# Altium integrated library Res-THP_V2.IntLib: 460 symbols (part 2 of 3) (continued)
## 100R-1W-PR01-5%
designator R?  value 100R  Watt: 1W  (hidden comment: 100R-1W-PR01-5%)
Resistor Power Metal Film; Manufacturer: Various; Part Number: 100R 5% 1W; Tol: 5%; Package: RES-PR01; EDM-PN: *; Text2: *; Text1: *
footprint RES-PR01 (RES-PR01 6.5x2.5mm)
pins: 1, 2

## 100R-2W-5%-MOF-1000
designator R?, comment value 100R  Watt: 2W  (hidden comment: 100R-2W-5%)
Resistor Metal Oxide Film; Manufacturer: Various; Part Number: 100R 5% 2W MOF; Tol: 5%; Package: RES-2W-1000; EDM-PN: *; Text2: *; Text1: *
footprint RES-2W-1000 (RES 2W 12.0x5.0mm)
pins: 1, 2

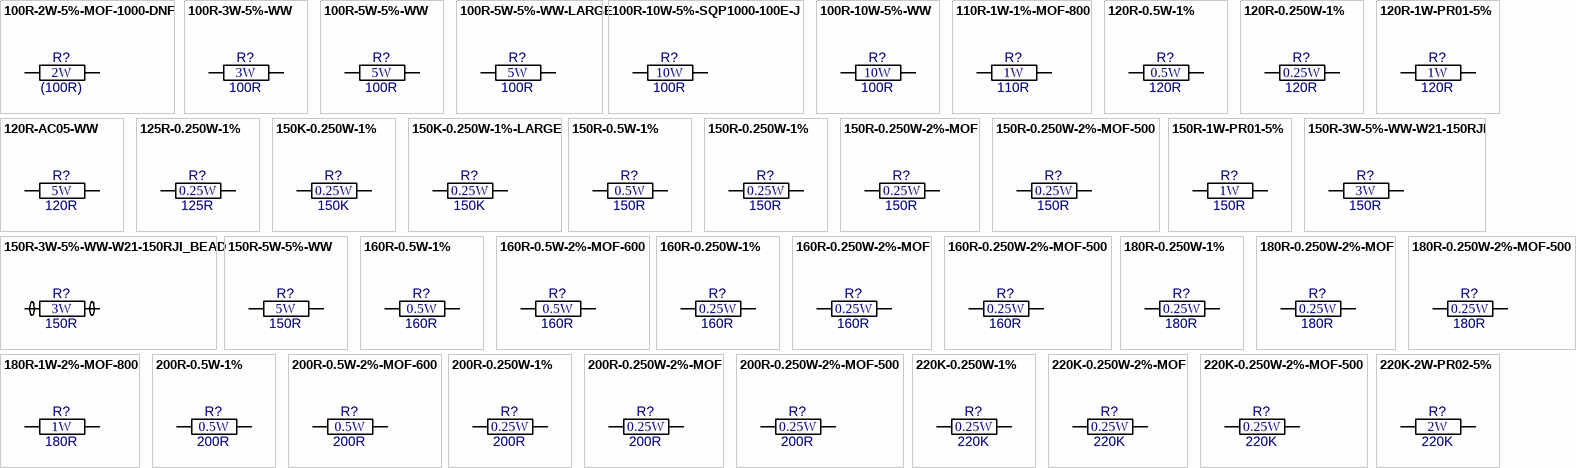
[diagram p8: symbols 100R-2W-5%-MOF-1000-DNF to 220K-2W-PR02-5%]

## 100R-2W-5%-MOF-1000-DNF
designator R?, comment value (100R)  Watt: 2W  (hidden comment: 100R-2W-5%)
Resistor Metal Oxide Film - Do not Fit; Manufacturer: Various; Part Number: DNF - 100R 5% 2W MOF; Tol: 5%; Package: RES-2W-1000; EDM-PN: *; Text2: *; Text1: *
footprint RES-2W-1000 (RES 2W 12.0x5.0mm)
pins: 1, 2

## 100R-3W-5%-WW
designator R?  value 100R  Watt: 3W  (hidden comment: 100R-3W-5%-WW)
Resistor Wirewound; Manufacturer: Various; Part Number: 100R 5% 3W WW; Tol: 5%; Package: RES-3W-WW; EDM-PN: *; Text2: *; Text1: *
footprint Res-3W-WW (Res 3W WW 13.0x5.5mm)
pins: 1, 2

## 100R-5W-5%-WW
designator R?  value 100R  Watt: 5W  (hidden comment: 100R-5W-5%-WW)
Resistor Wirewound; Manufacturer: Various; Part Number: 100R 5% 5W WW; Tol: 5%; Package: RES-5W-WW; EDM-PN: *; Text2: *; Text1: *
footprint Res-5W-WW (Res 5W WW 17.0x7.5mm)
pins: 1, 2

## 100R-5W-5%-WW-LARGE
designator R?, comment value 100R  Watt: 5W  (hidden comment: 100R-5W-5%-WW)
Resistor Wirewound; Manufacturer: Various; Part Number: 100R 5% 5W WW; Tol: 5%; Package: Res-5W-WW-LARGE; EDM-PN: *; Text2: *; Text1: *
footprint Res-5W-WW-LARGE (Res 5W WW 17.0x7.5mm)
pins: 1, 2

## 100R-10W-5%-SQP1000-100E-J
designator R?, comment value 100R  Watt: 10W  (hidden comment: SQP1000-100E-J)
Resistor Wirewound Cement/Ceramic; Manufacturer: HKR/Mantech; EDM-PN: RES1580; Tol: 5%; Part Number: SQP1000-100E-J; Package: RES-SQP1000; Text2: *; Text1: *
footprint RES-SQP1000 (SQP1000  48.0x9.5mm)
pins: 1, 2

## 100R-10W-5%-WW
designator R?  value 100R  Watt: 10W  (hidden comment: 100R-10W-5%-WW)
Resistor Wirewound; Manufacturer: Various; Part Number: 100R 5% 10W WW; Tol: 5%; Package: RES-10W-WW; EDM-PN: *; Text2: *; Text1: *
footprint Res-10W-WW (Res 10W WW 44.0x8.0mm)
pins: 1, 2

## 110R-1W-1%-MOF-800
designator R?, comment value 110R  Watt: 1W  (hidden comment: 110R-1W-1%)
Resistor Metal Oxide Film; Manufacturer: Various; Part Number: 110R 1% 1W MOF; Tol: 1%; Package: RES-1W-800; EDM-PN: *; Text2: *; Text1: *
footprint RES-1W-800 (RES 1W 12.0x5.0mm)
pins: 1, 2

## 120R-0.5W-1%
designator R?, comment value 120R  Watt: 0.5W  (hidden comment: 120R-0.5W-1%_H)
Resistor Metal Film; Manufacturer: Various; Part Number: 120R 1% 0.5W; Tol: 1%; Package: RES-0.5W; EDM-PN: *; Text2: *; Text1: *
footprint RES-0.5W (RES-0.5W 10.0x3.8mm)
pins: 1, 2

## 120R-0.250W-1%
designator R?, comment value 120R  Watt: 0.25W  (hidden comment: 120R-0.250W-1%_H)
Resistor Metal Film; Manufacturer: Various; Part Number: 120R 1% 0.25W; Tol: 1%; Package: RES-0.250W; EDM-PN: *; Text2: *; Text1: *
footprint RES-0.250W (Res 0.25W 7.6x2.3mm)
pins: 1, 2

## 120R-1W-PR01-5%
designator R?  value 120R  Watt: 1W  (hidden comment: 120R-1W-PR01-5%)
Resistor Power Metal Film; Manufacturer: Various; Part Number: 120R 5% 1W; Tol: 5%; Package: RES-PR01; EDM-PN: *; Text2: *; Text1: *
footprint RES-PR01 (RES-PR01 6.5x2.5mm)
pins: 1, 2

## 120R-AC05-WW
designator R?  value 120R  Watt: 5W  (hidden comment: 120R-AC05-WW)
Resistor Wirewound; Manufacturer: Various; Part Number: 120R 5% AC05; Tol: 5%; Package: RES-AC05; EDM-PN: *; Text2: *; Text1: *
footprint Res-AC05 (Res AC05 18.0x10.0mm)
pins: 1, 2

## 125R-0.250W-1%
designator R?, comment value 125R  Watt: 0.25W  (hidden comment: 125R-0.250W-1%_H)
Resistor Metal Film; Manufacturer: Various; Part Number: 125R 1% 0.25W; Tol: 1%; Package: RES-0.250W; EDM-PN: *; Text2: *; Text1: *
footprint RES-0.250W (Res 0.25W 7.6x2.3mm)
pins: 1, 2

## 150K-0.250W-1%
designator R?, comment value 150K  Watt: 0.25W  (hidden comment: 150K-0.250W-1%_H)
Resistor Metal Film; Manufacturer: Various; Part Number: 150K 1% 0.25W; Tol: 1%; Package: RES-0.250W; EDM-PN: *; Text2: *; Text1: *
footprint RES-0.250W (Res 0.25W 7.6x2.3mm)
pins: 1, 2

## 150K-0.250W-1%-LARGE
designator R?, comment value 150K  Watt: 0.25W  (hidden comment: 150K-0.250W-1%_H)
Resistor Metal Film; Manufacturer: Various; Part Number: 150K 1% 0.25W; Tol: 1%; Package: RES-0.250W-LARGE; EDM-PN: *; Text2: *; Text1: *
footprint RES-0.250W-LARGE (Res 0.25W 7.6x2.3mm)
pins: 1, 2

## 150R-0.5W-1%
designator R?, comment value 150R  Watt: 0.5W  (hidden comment: 150R-0.5W-1%_H)
Resistor Metal Film; Manufacturer: Various; Part Number: 150R 1% 0.5W; Tol: 1%; Package: RES-0.5W; EDM-PN: *; Text2: *; Text1: *
footprint RES-0.5W (RES-0.5W 10.0x3.8mm)
pins: 1, 2

## 150R-0.250W-1%
designator R?, comment value 150R  Watt: 0.25W  (hidden comment: 150R-0.250W-1%_H)
Resistor Metal Film; Manufacturer: Various; Part Number: 150R 1% 0.25W; Tol: 1%; Package: RES-0.250W; EDM-PN: *; Text2: *; Text1: *
footprint RES-0.250W (Res 0.25W 7.6x2.3mm)
pins: 1, 2

## 150R-0.250W-2%-MOF
designator R?, comment value 150R  Watt: 0.25W  (hidden comment: 150R-0.250W-2%)
Resistor Metal Oxide Film; Manufacturer: Various; Part Number: 150R 2% 0.25W MOF; Tol: 2%; Package: RES-0.250W; EDM-PN: *; Text2: *; Text1: *
footprint RES-0.250W (Res 0.25W 7.6x2.3mm)
pins: 1, 2

## 150R-0.250W-2%-MOF-500
designator R?, comment value 150R  Watt: 0.25W  (hidden comment: 150R-0.250W-2%)
Resistor Metal Oxide Film; Manufacturer: Various; Part Number: 150R 2% 0.25W MOF; Tol: 2%; Package: RES-0.250W-500; EDM-PN: *; Text2: *; Text1: *
footprint RES-0.250W-500 (Res 0.25W 7.6x2.3mm)
pins: 1, 2

## 150R-1W-PR01-5%
designator R?  value 150R  Watt: 1W  (hidden comment: 150R-1W-PR01-5%)
Resistor Power Metal Film; Manufacturer: Various; Part Number: 150R 5% 1W; Tol: 5%; Package: RES-PR01; EDM-PN: *; Text2: *; Text1: *
footprint RES-PR01 (RES-PR01 6.5x2.5mm)
pins: 1, 2

## 150R-3W-5%-WW-W21-150RJI
designator R?, comment value 150R  Watt: 3W  (hidden comment: W21-150RJI)
Resistor Wirewound; Manufacturer: TT Electronics/Welwyn; Tol: 5%; Part Number: W21-150RJI; Package: RES-W21; EDM-PN: *; Text2: *; Text1: *
footprint Res-W21 (Res W21 12.7x5.6mm)
pins: 1, 2

## 150R-3W-5%-WW-W21-150RJI_BEAD
designator R?, comment value 150R  Watt: 3W  (hidden comment: W21-150RJI)
Resistor Wirewound and Bead; Manufacturer: TT Electronics/Welwyn & RS; Part Number: W21-150RJI & 536-4062; Tol: 5%; Package: RES-W21-BEAD; EDM-PN: *; Text2: *; Text1: *
footprint Res-W21-BEAD (Res W21 12.7x5.6mm)
pins: 1, 2

## 150R-5W-5%-WW
designator R?  value 150R  Watt: 5W  (hidden comment: 150R-5W-5%-WW)
Resistor Wirewound; Manufacturer: Various; Part Number: 150R 5% 5W WW; Tol: 5%; Package: RES-5W-WW; EDM-PN: *; Text2: *; Text1: *
footprint Res-5W-WW (Res 5W WW 17.0x7.5mm)
pins: 1, 2

## 160R-0.5W-1%
designator R?, comment value 160R  Watt: 0.5W  (hidden comment: 160R-0.5W-1%_H)
Resistor Metal Film; Manufacturer: Various; Part Number: 160R 1% 0.5W; Tol: 1%; Package: RES-0.5W; EDM-PN: *; Text2: *; Text1: *
footprint RES-0.5W (RES-0.5W 10.0x3.8mm)
pins: 1, 2

## 160R-0.5W-2%-MOF-600
designator R?, comment value 160R  Watt: 0.5W  (hidden comment: 160R-0.5W-2%)
Resistor Metal Oxide Film; Manufacturer: Various; Part Number: 160R 2% 0.5W MOF; Tol: 2%; Package: RES-0.5W-600; EDM-PN: *; Text2: *; Text1: *
footprint RES-0.5W-600 (RES-0.5W 10.0x3.8mm)
pins: 1, 2

## 160R-0.250W-1%
designator R?, comment value 160R  Watt: 0.25W  (hidden comment: 160R-0.250W-1%_H)
Resistor Metal Film; Manufacturer: Various; Part Number: 160R 1% 0.25W; Tol: 1%; Package: RES-0.250W; EDM-PN: *; Text2: *; Text1: *
footprint RES-0.250W (Res 0.25W 7.6x2.3mm)
pins: 1, 2

## 160R-0.250W-2%-MOF
designator R?, comment value 160R  Watt: 0.25W  (hidden comment: 160R-0.250W-2%)
Resistor Metal Oxide Film; Manufacturer: Various; Part Number: 160R 2% 0.25W MOF; Tol: 2%; Package: RES-0.250W; EDM-PN: *; Text2: *; Text1: *
footprint RES-0.250W (Res 0.25W 7.6x2.3mm)
pins: 1, 2

## 160R-0.250W-2%-MOF-500
designator R?, comment value 160R  Watt: 0.25W  (hidden comment: 160R-0.250W-2%)
Resistor Metal Oxide Film; Manufacturer: Various; Part Number: 160R 2% 0.25W MOF; Tol: 2%; Package: RES-0.250W-500; EDM-PN: *; Text2: *; Text1: *
footprint RES-0.250W-500 (Res 0.25W 7.6x2.3mm)
pins: 1, 2

## 180R-0.250W-1%
designator R?  value 180R  Watt: 0.25W  (hidden comment: 180R-0.250W-1%)
Resistor Metal Film; Manufacturer: Various; Part Number: 180R 1% 0.25W; Tol: 1%; Package: RES-0.250W; EDM-PN: *; Text2: *; Text1: *
footprint RES-0.250W (Res 0.25W 7.6x2.3mm)
pins: 1, 2

## 180R-0.250W-2%-MOF
designator R?, comment value 180R  Watt: 0.25W  (hidden comment: 180R-0.250W-2%)
Resistor Metal Oxide Film; Manufacturer: Various; Part Number: 180R 2% 0.25W MOF; Tol: 2%; Package: RES-0.250W; EDM-PN: *; Text2: *; Text1: *
footprint RES-0.250W (Res 0.25W 7.6x2.3mm)
pins: 1, 2

## 180R-0.250W-2%-MOF-500
designator R?, comment value 180R  Watt: 0.25W  (hidden comment: 180R-0.250W-2%_H)
Resistor Metal Oxide Film; Manufacturer: Various; Part Number: 180R 2% 0.25W MOF; Tol: 2%; Package: RES-0.250W-500; EDM-PN: *; Text2: *; Text1: *
footprint RES-0.250W-500 (Res 0.25W 7.6x2.3mm)
pins: 1, 2

## 180R-1W-2%-MOF-800
designator R?, comment value 180R  Watt: 1W  (hidden comment: 180R-1W-2%)
Resistor Metal Oxide Film; Manufacturer: Various; Part Number: 180R 2% 1W MOF; Tol: 2%; Package: RES-1W-800; EDM-PN: *; Text2: *; Text1: *
footprint RES-1W-800 (RES 1W 12.0x5.0mm)
pins: 1, 2

## 200R-0.5W-1%
designator R?  value 200R  Watt: 0.5W  (hidden comment: 200R-0.5W-1%)
Resistor Metal Film; Manufacturer: Various; Part Number: 200R 1% 0.5W; Tol: 1%; Package: RES-0.5W; EDM-PN: *; Text2: *; Text1: *
footprint RES-0.5W (RES-0.5W 10.0x3.8mm)
pins: 1, 2

## 200R-0.5W-2%-MOF-600
designator R?, comment value 200R  Watt: 0.5W  (hidden comment: 200R-0.5W-2%)
Resistor Metal Oxide Film; Manufacturer: Various; Part Number: 200R 2% 0.5W MOF; Tol: 2%; Package: RES-0.5W-600; EDM-PN: *; Text2: *; Text1: *
footprint RES-0.5W-600 (RES-0.5W 10.0x3.8mm)
pins: 1, 2

## 200R-0.250W-1%
designator R?  value 200R  Watt: 0.25W  (hidden comment: 200R-0.250W-1%)
Resistor Metal Film; Manufacturer: Various; Part Number: 200R 1% 0.25W; Tol: 1%; Package: RES-0.250W; EDM-PN: *; Text2: *; Text1: *
footprint RES-0.250W (Res 0.25W 7.6x2.3mm)
pins: 1, 2

## 200R-0.250W-2%-MOF
designator R?, comment value 200R  Watt: 0.25W  (hidden comment: 200R-0.250W-2%)
Resistor Metal Oxide Film; Manufacturer: Various; Part Number: 200R 2% 0.25W MOF; Tol: 2%; Package: RES-0.250W; EDM-PN: *; Text2: *; Text1: *
footprint RES-0.250W (Res 0.25W 7.6x2.3mm)
pins: 1, 2

## 200R-0.250W-2%-MOF-500
designator R?, comment value 200R  Watt: 0.25W  (hidden comment: 200R-0.250W-2%)
Resistor Metal Oxide Film; Manufacturer: Various; Part Number: 200R 2% 0.25W MOF; Tol: 2%; Package: RES-0.250W-500; EDM-PN: *; Text2: *; Text1: *
footprint RES-0.250W-500 (Res 0.25W 7.6x2.3mm)
pins: 1, 2

## 220K-0.250W-1%
designator R?  value 220K  Watt: 0.25W  (hidden comment: 220K-0.250W-1%)
Resistor Metal Film; Manufacturer: Various; Part Number: 220K 1% 0.25W; Tol: 1%; Package: RES-0.250W; EDM-PN: *; Text2: *; Text1: *
footprint RES-0.250W (Res 0.25W 7.6x2.3mm)
pins: 1, 2

## 220K-0.250W-2%-MOF
designator R?, comment value 220K  Watt: 0.25W  (hidden comment: 220K-0.250W-2%)
Resistor Metal Oxide Film; Manufacturer: Various; Part Number: 220K 2% 0.25W MOF; Tol: 2%; Package: RES-0.250W; EDM-PN: *; Text2: *; Text1: *
footprint RES-0.250W (Res 0.25W 7.6x2.3mm)
pins: 1, 2

## 220K-0.250W-2%-MOF-500
designator R?, comment value 220K  Watt: 0.25W  (hidden comment: 220K-0.250W-2%)
Resistor Metal Oxide Film; Manufacturer: Various; Part Number: 220K 2% 0.25W MOF; Tol: 2%; Package: RES-0.250W-500; EDM-PN: *; Text2: *; Text1: *
footprint RES-0.250W-500 (Res 0.25W 7.6x2.3mm)
pins: 1, 2

## 220K-2W-PR02-5%
designator R?  value 220K  Watt: 2W  (hidden comment: 220K-2W-PR02-5%)
Resistor Power Metal Film; Manufacturer: Various; Part Number: 220K 5% 2W; Tol: 5%; Package: RES-PR02; EDM-PN: *; Text2: *; Text1: *
footprint RES-PR02 (RES 2W PMW 10.0x3.9mm)
pins: 1, 2

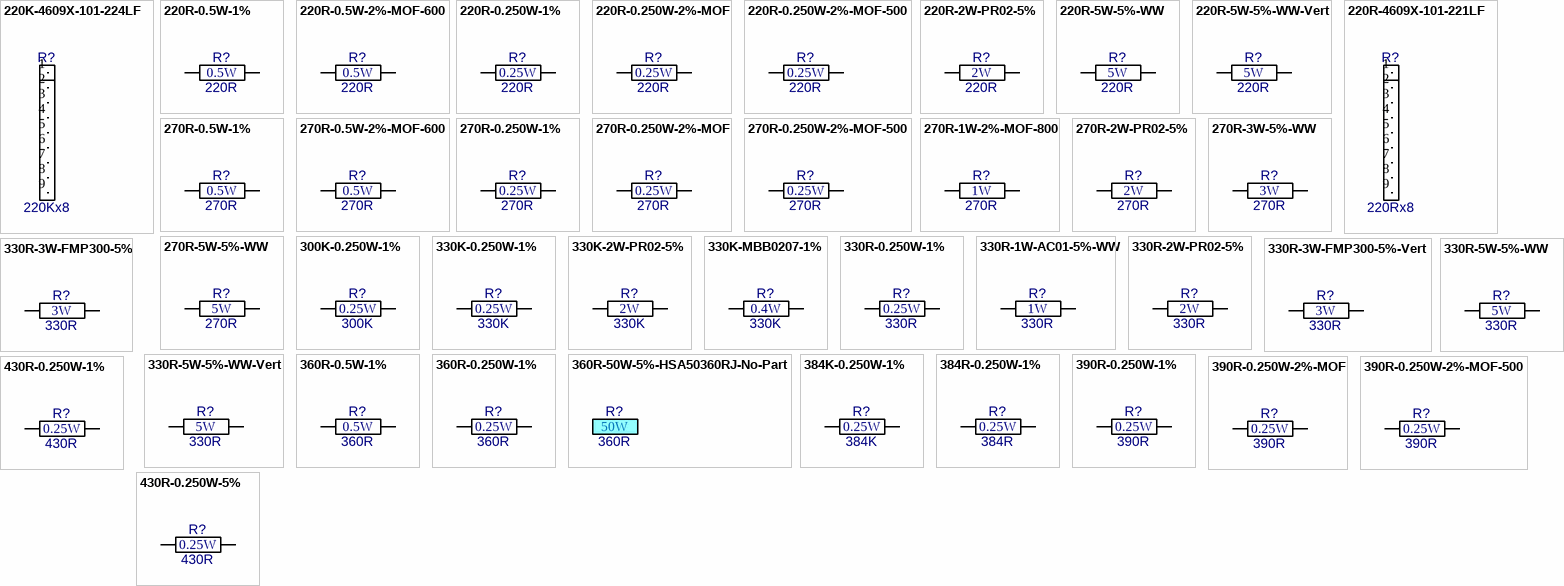
[diagram p9: symbols 220K-4609X-101-224LF to 430R-0.250W-5%]

## 220K-4609X-101-224LF
designator R?  value 220Kx8  (hidden comment: 220K-4609X-101-224LF)
Resistor Array 8 Res 9Pin; Manufacturer: Bourns; Tol: 1%; Watt: 200mW; Part Number: 4609X-101-224LF; Package: RES-4609X; EDM-PN: *; Text2: *; Text1: *
footprint RES-4609X (Res SIL 9 Pin 20.32x2.5mm)
pins: 1, 2, 3, 4, 5, 6, 7, 8, 9

## 220R-0.5W-1%
designator R?, comment value 220R  Watt: 0.5W  (hidden comment: 220R-0.5W-1%_H)
Resistor Metal Film; Manufacturer: Various; Part Number: 220R 1% 0.5W; Tol: 1%; Package: RES-0.5W; EDM-PN: *; Text2: *; Text1: *
footprint RES-0.5W (RES-0.5W 10.0x3.8mm)
pins: 1, 2

## 220R-0.5W-2%-MOF-600
designator R?, comment value 220R  Watt: 0.5W  (hidden comment: 220R-0.5W-2%_H)
Resistor Metal Oxide Film; Manufacturer: Various; Part Number: 220R 2% 0.5W MOF; Tol: 2%; Package: RES-0.5W-600; EDM-PN: *; Text2: *; Text1: *
footprint RES-0.5W-600 (RES-0.5W 10.0x3.8mm)
pins: 1, 2

## 220R-0.250W-1%
designator R?, comment value 220R  Watt: 0.25W  (hidden comment: 220R-0.250W-1%_H)
Resistor Metal Film; Manufacturer: Various; Part Number: 220R 1% 0.25W; Tol: 1%; Package: RES-0.250W; EDM-PN: *; Text2: *; Text1: *
footprint RES-0.250W (Res 0.25W 7.6x2.3mm)
pins: 1, 2

## 220R-0.250W-2%-MOF
designator R?, comment value 220R  Watt: 0.25W  (hidden comment: 220R-0.250W-2%)
Resistor Metal Oxide Film; Manufacturer: Various; Part Number: 220R 2% 0.25W MOF; Tol: 2%; Package: RES-0.250W; EDM-PN: *; Text2: *; Text1: *
footprint RES-0.250W (Res 0.25W 7.6x2.3mm)
pins: 1, 2

## 220R-0.250W-2%-MOF-500
designator R?, comment value 220R  Watt: 0.25W  (hidden comment: 220R-0.250W-2%_H)
Resistor Metal Oxide Film; Manufacturer: Various; Part Number: 220R 2% 0.25W MOF; Tol: 2%; Package: RES-0.250W-500; EDM-PN: *; Text2: *; Text1: *
footprint RES-0.250W-500 (Res 0.25W 7.6x2.3mm)
pins: 1, 2

## 220R-2W-PR02-5%
designator R?  value 220R  Watt: 2W  (hidden comment: 220R-2W-PR02-5%)
Resistor Power Metal Film; Manufacturer: Various; Part Number: 220R 5% 2W; Tol: 5%; Package: RES-PR02; EDM-PN: *; Text2: *; Text1: *
footprint RES-PR02 (RES 2W PMW 10.0x3.9mm)
pins: 1, 2

## 220R-5W-5%-WW
designator R?  value 220R  Watt: 5W  (hidden comment: 220R-5W-5%-WW)
Resistor Wirewound; Manufacturer: Various; Part Number: 220R 5% 5W WW; Tol: 5%; Package: RES-5W-WW; EDM-PN: *; Text2: *; Text1: *
footprint Res-5W-WW (Res 5W WW 17.0x7.5mm)
pins: 1, 2

## 220R-5W-5%-WW-Vert
designator R?, comment value 220R  Watt: 5W  (hidden comment: 220R-5W-5%-WW)
Resistor Wirewound; Manufacturer: Various; Part Number: 220R 5% 5W WW; Tol: 5%; Package: RES-5W-WW-Vert; EDM-PN: *; Text2: *; Text1: *
footprint Res-5W-WW-Vert (Res AC05 18.0x10.0mm)
pins: 1, 2

## 220R-4609X-101-221LF
designator R?  value 220Rx8  (hidden comment: 220R-4609X-101-221LF)
Resistor Array 8 Res 9Pin; Manufacturer: Bourns; Tol: 1%; Watt: 200mW; Part Number: 4609X-101-221LF; Package: RES-4609X; EDM-PN: *; Text2: *; Text1: *
footprint RES-4609X (Res SIL 9 Pin 20.32x2.5mm)
pins: 1, 2, 3, 4, 5, 6, 7, 8, 9

## 270R-0.5W-1%
designator R?, comment value 270R  Watt: 0.5W  (hidden comment: 270R-0.5W-1%_H)
Resistor Metal Film; Manufacturer: Various; Part Number: 270R 1% 0.5W; Tol: 1%; Package: RES-0.5W; EDM-PN: *; Text2: *; Text1: *
footprint RES-0.5W (RES-0.5W 10.0x3.8mm)
pins: 1, 2

## 270R-0.5W-2%-MOF-600
designator R?, comment value 270R  Watt: 0.5W  (hidden comment: 270R-0.5W-2%_H)
Resistor Metal Oxide Film; Manufacturer: Various; Part Number: 270R 2% 0.5W MOF; Tol: 2%; Package: RES-0.5W-600; EDM-PN: *; Text2: *; Text1: *
footprint RES-0.5W-600 (RES-0.5W 10.0x3.8mm)
pins: 1, 2

## 270R-0.250W-1%
designator R?, comment value 270R  Watt: 0.25W  (hidden comment: 270R-0.250W-1%_H)
Resistor Metal Film; Manufacturer: Various; Part Number: 270R 1% 0.25W; Tol: 1%; Package: RES-0.250W; EDM-PN: *; Text2: *; Text1: *
footprint RES-0.250W (Res 0.25W 7.6x2.3mm)
pins: 1, 2

## 270R-0.250W-2%-MOF
designator R?, comment value 270R  Watt: 0.25W  (hidden comment: 270R-0.250W-2%)
Resistor Metal Oxide Film; Manufacturer: Various; Part Number: 270R 2% 0.25W MOF; Tol: 2%; Package: RES-0.250W; EDM-PN: *; Text2: *; Text1: *
footprint RES-0.250W (Res 0.25W 7.6x2.3mm)
pins: 1, 2

## 270R-0.250W-2%-MOF-500
designator R?, comment value 270R  Watt: 0.25W  (hidden comment: 270R-0.250W-2%)
Resistor Metal Oxide Film; Manufacturer: Various; Part Number: 270R 2% 0.25W MOF; Tol: 2%; Package: RES-0.250W-500; EDM-PN: *; Text2: *; Text1: *
footprint RES-0.250W-500 (Res 0.25W 7.6x2.3mm)
pins: 1, 2

## 270R-1W-2%-MOF-800
designator R?, comment value 270R  Watt: 1W  (hidden comment: 270R-1W-2%)
Resistor Metal Oxide Film; Manufacturer: Various; Part Number: 270R 2% 1W MOF; Tol: 2%; Package: RES-1W-800; EDM-PN: *; Text2: *; Text1: *
footprint RES-1W-800 (RES 1W 12.0x5.0mm)
pins: 1, 2

## 270R-2W-PR02-5%
designator R?  value 270R  Watt: 2W  (hidden comment: 270R-2W-PR02-5%)
Resistor Power Metal Film; Manufacturer: Various; Part Number: 270R 5% 2W; Tol: 5%; Package: RES-PR02; EDM-PN: *; Text2: *; Text1: *
footprint RES-PR02 (RES 2W PMW 10.0x3.9mm)
pins: 1, 2

## 270R-3W-5%-WW
designator R?  value 270R  Watt: 3W  (hidden comment: 270R-3W-5%-WW)
Resistor Wirewound; Manufacturer: Various; Part Number: 270R 5% 3W WW; Tol: 5%; Package: RES-3W-WW; EDM-PN: *; Text2: *; Text1: *
footprint Res-3W-WW (Res 3W WW 13.0x5.5mm)
pins: 1, 2

## 270R-5W-5%-WW
designator R?  value 270R  Watt: 5W  (hidden comment: 270R-5W-5%-WW)
Resistor Wirewound; Manufacturer: Various; Part Number: 270R 5% 5W WW; Tol: 5%; Package: RES-5W-WW; EDM-PN: *; Text2: *; Text1: *
footprint Res-5W-WW (Res 5W WW 17.0x7.5mm)
pins: 1, 2

## 300K-0.250W-1%
designator R?, comment value 300K  Watt: 0.25W  (hidden comment: 300K-0.250W-1%_H)
Resistor Metal Film; Manufacturer: Various; Part Number: 300K 1% 0.25W; Tol: 1%; Package: RES-0.250W; EDM-PN: *; Text2: *; Text1: *
footprint RES-0.250W (Res 0.25W 7.6x2.3mm)
pins: 1, 2

## 330K-0.250W-1%
designator R?, comment value 330K  Watt: 0.25W  (hidden comment: 330K-0.250W-1%_H)
Resistor Metal Film; Manufacturer: Various; Part Number: 330K 1% 0.25W; Tol: 1%; Package: RES-0.250W; EDM-PN: *; Text2: *; Text1: *
footprint RES-0.250W (Res 0.25W 7.6x2.3mm)
pins: 1, 2

## 330K-2W-PR02-5%
designator R?  value 330K  Watt: 2W  (hidden comment: 330K-2W-PR02-5%)
Resistor Power Metal Film; Manufacturer: Various; Part Number: 330K 5% 2W; Tol: 5%; Package: RES-PR02; EDM-PN: *; Text2: *; Text1: *
footprint RES-PR02 (RES 2W PMW 10.0x3.9mm)
pins: 1, 2

## 330K-MBB0207-1%
designator R?, comment value 330K  Watt: 0.4W  (hidden comment: 330K-MBB0207-1%_H)
Resistor Metal Film; Manufacturer: Vishay; Part Number: 330K 1% MBB0207; Tol: 1%; Package: RES-MBB0207; EDM-PN: *; Text2: *; Text1: *; Reutech PN: 5905-99-0333
footprint RES-MBB0207 (MBB0207 6.3x2.5mm)
pins: 1, 2

## 330R-0.250W-1%
designator R?, comment value 330R  Watt: 0.25W  (hidden comment: 330R-0.250W-1%_H)
Resistor Metal Film; Manufacturer: Various; Part Number: 330R 1% 0.25W; Tol: 1%; Package: RES-0.250W; EDM-PN: *; Text2: *; Text1: *
footprint RES-0.250W (Res 0.25W 7.6x2.3mm)
pins: 1, 2

## 330R-1W-AC01-5%-WW
designator R?  value 330R  Watt: 1W  (hidden comment: 330R-1W-AC01-5%-WW)
Resistor Wirewound; Manufacturer: Vishay; Part Number: AC01000003300JA100; Tol: 5%; Package: RES-AC01; EDM-PN: *; Text2: *; Text1: *
footprint RES-AC01 (AC03 11.0x4.3mm)
pins: 1, 2

## 330R-2W-PR02-5%
designator R?  value 330R  Watt: 2W  (hidden comment: 330R-2W-PR02-5%)
Resistor Power Metal Film; Manufacturer: Various; Part Number: 330R 5% 2W; Tol: 5%; Package: RES-PR02; EDM-PN: *; Text2: *; Text1: *
footprint RES-PR02 (RES 2W PMW 10.0x3.9mm)
pins: 1, 2

## 330R-3W-FMP300-5%
designator R?  value 330R  Watt: 3W  (hidden comment: 330R-3W-FMP300-5%)
Resistor Power Metal Film; Manufacturer: Yageo; Part Number: FMP300JR-73-330R; Tol: 5%; Package: Res-FMP300; EDM-PN: *; Text2: *; Text1: *
footprint Res-FMP300 (FMP300 15.5x5.0mm)
pins: 1, 2

## 330R-3W-FMP300-5%-Vert
designator R?  value 330R  Watt: 3W  (hidden comment: 330R-3W-FMP300-5%-Vert)
Resistor Power Metal Film; Manufacturer: Yageo; Part Number: FMP300JR-73-330R; Tol: 5%; Package: Res-FMP300-Vert; EDM-PN: *; Text2: *; Text1: *
footprint Res-FMP300-Vert (FMP300 15.5x5.0mm)
pins: 1, 2

## 330R-5W-5%-WW
designator R?  value 330R  Watt: 5W  (hidden comment: 330R-5W-5%-WW)
Resistor Wirewound; Manufacturer: Various; Part Number: 330R 5% 5W WW; Tol: 5%; Package: RES-5W-WW; EDM-PN: *; Text2: *; Text1: *
footprint Res-5W-WW (Res 5W WW 17.0x7.5mm)
pins: 1, 2

## 330R-5W-5%-WW-Vert
designator R?, comment value 330R  Watt: 5W  (hidden comment: 330R-5W-5%-WW)
Resistor Wirewound; Manufacturer: Various; Part Number: 330R 5% 5W WW; Tol: 5%; Package: RES-5W-WW-Vert; EDM-PN: *; Text2: *; Text1: *
footprint Res-5W-WW-Vert (Res AC05 18.0x10.0mm)
pins: 1, 2

## 360R-0.5W-1%
designator R?  value 360R  Watt: 0.5W  (hidden comment: 360R-0.5W-1%)
Resistor Metal Film; Manufacturer: Various; Part Number: 360R 1% 0.5W; Tol: 1%; Package: RES-0.5W; EDM-PN: *; Text2: *; Text1: *
footprint RES-0.5W (RES-0.5W 10.0x3.8mm)
pins: 1, 2

## 360R-0.250W-1%
designator R?, comment value 360R  Watt: 0.25W  (hidden comment: 360R-0.250W-1%_H)
Resistor Metal Film; Manufacturer: Various; Part Number: 360R 1% 0.25W; Tol: 1%; Package: RES-0.250W; EDM-PN: *; Text2: *; Text1: *
footprint RES-0.250W (Res 0.25W 7.6x2.3mm)
pins: 1, 2

## 360R-50W-5%-HSA50360RJ-No-Part
designator R?, comment value 360R  Watt: 50W  (hidden comment: HSA50360RJ)  (mechanical)
Resistor Wirewound Chassis Mount; Manufacturer: Tyco; Tol: 5%; Reutech PN: 5905-WW-0140; Part Number: HSA50360RJ; Package: NA; EDM-PN: *; Text2: *; Text1: *

## 384K-0.250W-1%
designator R?, comment value 384K  Watt: 0.25W  (hidden comment: 384K-0.250W-1%_H)
Resistor Metal Film; Manufacturer: Various; Part Number: 384K 1% 0.25W; Tol: 1%; Package: RES-0.250W; EDM-PN: *; Text2: *; Text1: *
footprint RES-0.250W (Res 0.25W 7.6x2.3mm)
pins: 1, 2

## 384R-0.250W-1%
designator R?, comment value 384R  Watt: 0.25W  (hidden comment: 384R-0.250W-1%_H)
Resistor Metal Film; Manufacturer: Various; Part Number: 384R 1% 0.25W; Tol: 1%; Package: RES-0.250W; EDM-PN: *; Text2: *; Text1: *
footprint RES-0.250W (Res 0.25W 7.6x2.3mm)
pins: 1, 2

## 390R-0.250W-1%
designator R?  value 390R  Watt: 0.25W  (hidden comment: 390R-0.250W-1%)
Resistor Metal Film; Manufacturer: Various; Part Number: 390R 1% 0.25W; Tol: 1%; Package: RES-0.250W; EDM-PN: *; Text2: *; Text1: *
footprint RES-0.250W (Res 0.25W 7.6x2.3mm)
pins: 1, 2

## 390R-0.250W-2%-MOF
designator R?, comment value 390R  Watt: 0.25W  (hidden comment: 390R-0.250W-2%)
Resistor Metal Oxide Film; Manufacturer: Various; Part Number: 390R 2% 0.25W MOF; Tol: 2%; Package: RES-0.250W; EDM-PN: *; Text2: *; Text1: *
footprint RES-0.250W (Res 0.25W 7.6x2.3mm)
pins: 1, 2

## 390R-0.250W-2%-MOF-500
designator R?, comment value 390R  Watt: 0.25W  (hidden comment: 390R-0.250W-2%_H)
Resistor Metal Oxide Film; Manufacturer: Various; Part Number: 390R 2% 0.25W MOF; Tol: 2%; Package: RES-0.250W-500; EDM-PN: *; Text2: *; Text1: *
footprint RES-0.250W-500 (Res 0.25W 7.6x2.3mm)
pins: 1, 2

## 430R-0.250W-1%
designator R?, comment value 430R  Watt: 0.25W  (hidden comment: 430R-0.250W-1%_H)
Resistor Metal Film; Manufacturer: Various; Part Number: 430R 1% 0.25W; Tol: 1%; Package: RES-0.250W; EDM-PN: *; Text2: *; Text1: *
footprint RES-0.250W (Res 0.25W 7.6x2.3mm)
pins: 1, 2

## 430R-0.250W-5%
designator R?, comment value 430R  Watt: 0.25W  (hidden comment: 430R-0.250W-5%_H)
Resistor Carbon; Manufacturer: Various; Part Number: 430R 5% 0.25W; Tol: 5%; Package: RES-0.250W; EDM-PN: *; Text2: *; Text1: *
footprint RES-0.250W (Res 0.25W 7.6x2.3mm)
pins: 1, 2

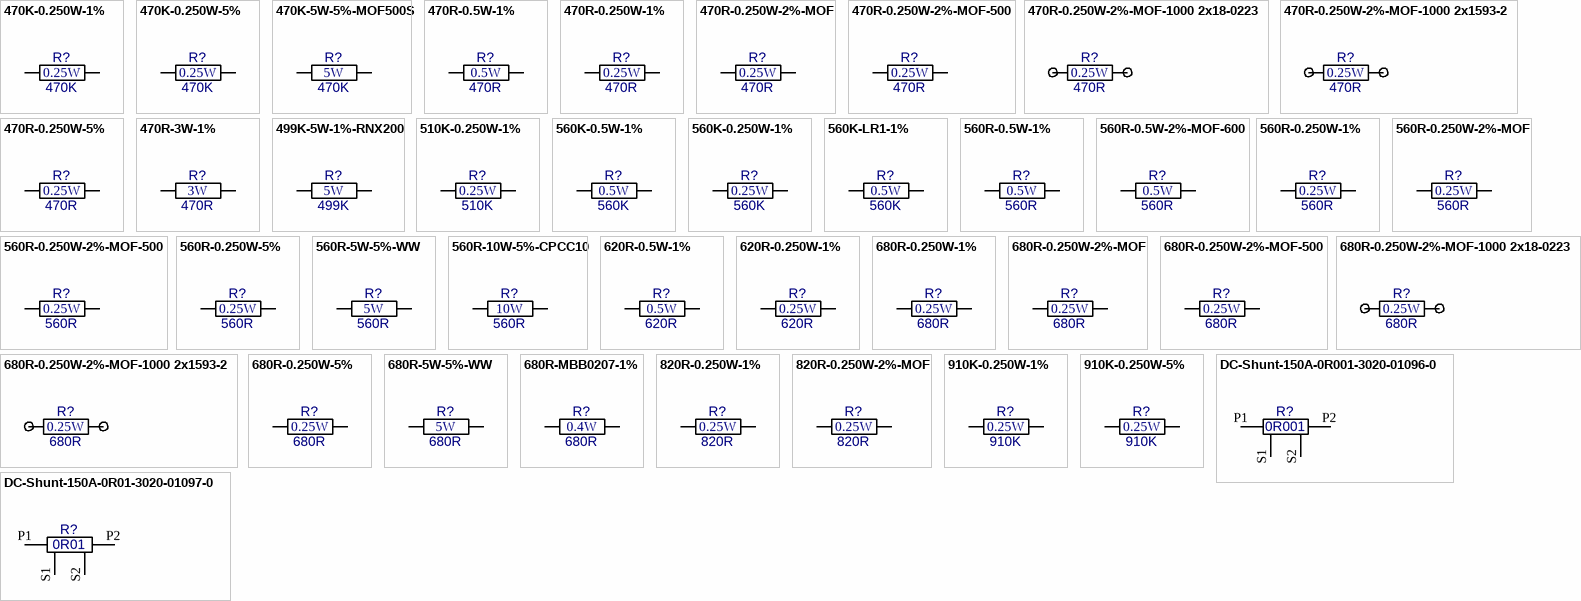
[diagram p10: symbols 470K-0.250W-1% to DC-Shunt-150A-0R01-3020-01097-0]

## 470K-0.250W-1%
designator R?  value 470K  Watt: 0.25W  (hidden comment: 470K-0.250W-1%)
Resistor Metal Film; Manufacturer: Various; Part Number: 470K 1% 0.25W; Tol: 1%; Package: RES-0.250W; EDM-PN: *; Text2: *; Text1: *
footprint RES-0.250W (Res 0.25W 7.6x2.3mm)
pins: 1, 2

## 470K-0.250W-5%
designator R?, comment value 470K  Watt: 0.25W  (hidden comment: 470K-0.250W-5%_H)
Resistor Carbon; Manufacturer: Various; Part Number: 470K 5% 0.25W; Tol: 5%; Package: RES-0.250W; EDM-PN: *; Text2: *; Text1: *
footprint RES-0.250W (Res 0.25W 7.6x2.3mm)
pins: 1, 2

## 470K-5W-5%-MOF500S
designator R?, comment value 470K  Watt: 5W  (hidden comment: 470K-5W-5%_H-MOF500S)
Resistor Metal Oxide Flameproof; Manufacturer: HKR; Part Number: MOF500S-470K-J; Tol: 5%; Package: Res-5W-WW; EDM-PN: *; Text2: *; Text1: *
footprint Res-5W-WW (Res 5W WW 17.0x7.5mm)
pins: 1, 2

## 470R-0.5W-1%
designator R?, comment value 470R  Watt: 0.5W  (hidden comment: 470R-0.5W-1%_H)
Resistor Metal Film; Manufacturer: Various; Part Number: 470R 1% 0.5W; Tol: 1%; Package: RES-0.5W; EDM-PN: *; Text2: *; Text1: *
footprint RES-0.5W (RES-0.5W 10.0x3.8mm)
pins: 1, 2

## 470R-0.250W-1%
designator R?, comment value 470R  Watt: 0.25W  (hidden comment: 470R-0.250W-1%_H)
Resistor Metal Film; Manufacturer: Various; Part Number: 470R 1% 0.25W; Tol: 1%; Package: RES-0.250W; EDM-PN: *; Text2: *; Text1: *
footprint RES-0.250W (Res 0.25W 7.6x2.3mm)
pins: 1, 2

## 470R-0.250W-2%-MOF
designator R?, comment value 470R  Watt: 0.25W  (hidden comment: 470R-0.250W-2%)
Resistor Metal Oxide Film; Manufacturer: Various; Part Number: 470R 2% 0.25W MOF; Tol: 2%; Package: RES-0.250W; EDM-PN: *; Text2: *; Text1: *
footprint RES-0.250W (Res 0.25W 7.6x2.3mm)
pins: 1, 2

## 470R-0.250W-2%-MOF-500
designator R?, comment value 470R  Watt: 0.25W  (hidden comment: 470R-0.250W-2%)
Resistor Metal Oxide Film; Manufacturer: Various; Part Number: 470R 2% 0.25W MOF; Tol: 2%; Package: RES-0.250W-500; EDM-PN: *; Text2: *; Text1: *
footprint RES-0.250W-500 (Res 0.25W 7.6x2.3mm)
pins: 1, 2

## 470R-0.250W-2%-MOF-1000 2x18-0223
designator R?, comment value 470R  Watt: 0.25W  (hidden comment: 470R-0.250W-2% & 2x18-0223)
Resistor Metal Oxide Film and 2 Terminals; Manufacturer: Various & Vero; Part Number: 470R 2% 0.25W MOF & 2x18-0223; Tol: 2%; Package: RES-0.250W-1000-18-0223; EDM-PN: *; Text2: *; Text1: *
footprint RES-0.250W-1000-18-0223 (Res 0.25W 7.6x2.3mm)
pins: 1, 2

## 470R-0.250W-2%-MOF-1000 2x1593-2
designator R?, comment value 470R  Watt: 0.25W  (hidden comment: 470R-0.250W-2% & 2x1593-2)
Resistor Metal Oxide Film and 2 Terminals; Manufacturer: Various & Keystone; Part Number: 470R 2% 0.25W MOF & 2x1593-2; Tol: 2%; Package: RES-0.250W-1000-1593-2; EDM-PN: *; Text2: *; Text1: *
footprint RES-0.250W-1000-1593-2 (Res 0.25W 7.6x2.3mm)
pins: 1, 2

## 470R-0.250W-5%
designator R?, comment value 470R  Watt: 0.25W  (hidden comment: 470R-0.250W-5%_H)
Resistor Carbon; Manufacturer: Various; Part Number: 470R 5% 0.25W; Tol: 5%; Package: RES-0.250W; EDM-PN: *; Text2: *; Text1: *
footprint RES-0.250W (Res 0.25W 7.6x2.3mm)
pins: 1, 2

## 470R-3W-1%
designator R?, comment value 470R  Watt: 3W  (hidden comment: 470R-3W-1%_H)
Resistor Power Silicone Coated Axial; Manufacturer: Various; Part Number: 470R 1% 3W; Tol: 1%; Reutech PN: 5908-CN-2041; Package: RES-RS02B; EDM-PN: *; Text2: *; Text1: *
footprint RES-RS02B (RS02B 14.2x4.75mm)
pins: 1, 2

## 499K-5W-1%-RNX200
designator R?, comment value 499K  Watt: 5W  (hidden comment: 499K-5W-1%_H-RNX200)
Resistor Metal Oxide High Voltage; Manufacturer: Vishay; Part Number: RNX200499KFKEL; Tol: 1%; Package: RES-RNX200; EDM-PN: *; Text2: *; Text1: *
footprint Res-RNX200 (RNX200 WW 17.0x7.5mm)
pins: 1, 2

## 510K-0.250W-1%
designator R?, comment value 510K  Watt: 0.25W  (hidden comment: 510K-0.250W-1%_H)
Resistor Metal Film; Manufacturer: Various; Part Number: 510K 1% 0.25W; Tol: 1%; Package: RES-0.250W; EDM-PN: *; Text2: *; Text1: *
footprint RES-0.250W (Res 0.25W 7.6x2.3mm)
pins: 1, 2

## 560K-0.5W-1%
designator R?, comment value 560K  Watt: 0.5W  (hidden comment: 560K-0.5W-1%_H)
Resistor Metal Film; Manufacturer: Various; Part Number: 560K 1% 0.5W; Tol: 1%; Package: RES-0.5W; EDM-PN: *; Text2: *; Text1: *
footprint RES-0.5W (RES-0.5W 10.0x3.8mm)
pins: 1, 2

## 560K-0.250W-1%
designator R?, comment value 560K  Watt: 0.25W  (hidden comment: 560K-0.250W-1%_H)
Resistor Metal Film; Manufacturer: Various; Part Number: 560K 1% 0.25W; Tol: 1%; Package: RES-0.250W; EDM-PN: *; Text2: *; Text1: *
footprint RES-0.250W (Res 0.25W 7.6x2.3mm)
pins: 1, 2

## 560K-LR1-1%
designator R?, comment value 560K  Watt: 0.5W  (hidden comment: 560K-LR1-1%_H)
Resistor Metal Film; Manufacturer: Tyco; Part Number: LR1F560K; Tol: 1%; Package: RES-LR1; EDM-PN: *; Text2: *; Text1: *
footprint RES-LR1 (Res LR1 6.2x2.3mm)
pins: 1, 2

## 560R-0.5W-1%
designator R?, comment value 560R  Watt: 0.5W  (hidden comment: 560R-0.5W-1%_H)
Resistor Metal Film; Manufacturer: Various; Part Number: 560R 1% 0.5W; Tol: 1%; Package: RES-0.5W; EDM-PN: *; Text2: *; Text1: *
footprint RES-0.5W (RES-0.5W 10.0x3.8mm)
pins: 1, 2

## 560R-0.5W-2%-MOF-600
designator R?, comment value 560R  Watt: 0.5W  (hidden comment: 560R-0.5W-2%_H)
Resistor Metal Oxide Film; Manufacturer: Various; Part Number: 560R 2% 0.5W MOF; Tol: 2%; Package: RES-0.5W-600; EDM-PN: *; Text2: *; Text1: *
footprint RES-0.5W-600 (RES-0.5W 10.0x3.8mm)
pins: 1, 2

## 560R-0.250W-1%
designator R?, comment value 560R  Watt: 0.25W  (hidden comment: 560R-0.250W-1%_H)
Resistor Metal Film; Manufacturer: Various; Part Number: 560R 1% 0.25W; Tol: 1%; Package: RES-0.250W; EDM-PN: *; Text2: *; Text1: *
footprint RES-0.250W (Res 0.25W 7.6x2.3mm)
pins: 1, 2

## 560R-0.250W-2%-MOF
designator R?, comment value 560R  Watt: 0.25W  (hidden comment: 560R-0.250W-2%)
Resistor Metal Oxide Film; Manufacturer: Various; Part Number: 560R 2% 0.25W MOF; Tol: 2%; Package: RES-0.250W; EDM-PN: *; Text2: *; Text1: *
footprint RES-0.250W (Res 0.25W 7.6x2.3mm)
pins: 1, 2